# Altium footprint library my_lib.PcbLib: 121 footprints (part 6 of 8)
Each footprint in its own frame and in the unit in brackets; x right, y up, seen from the top. Pads: shape width x height; smd on the part's side, far side on the other; paste and mask are expansions set on the pad; w line width, h text height; cw(c..) or ccw(c..) is an arc to the next point about the centre after c.
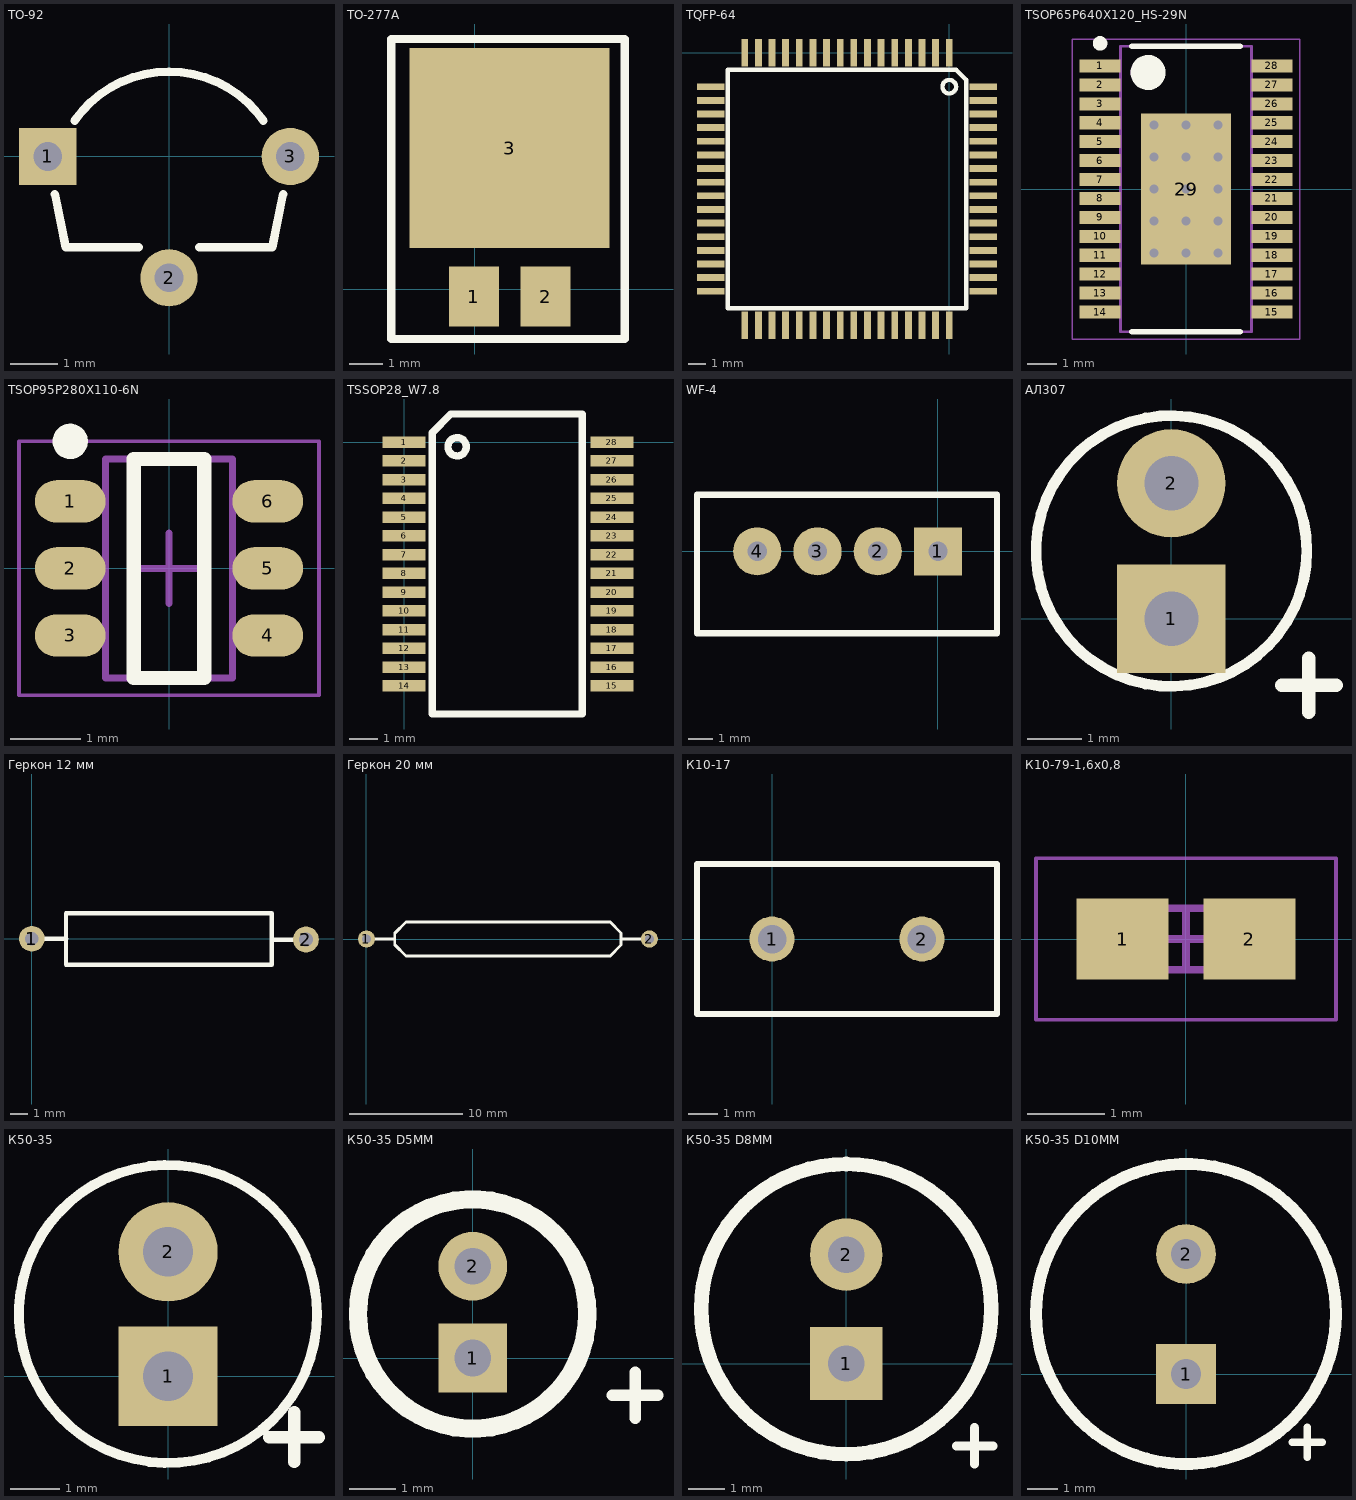
[diagram p5: the footprints below, top view; thin cyan lines are the x and y axes]

## TO-92 [mm]
pads (3):
  rect 1.2x1.2 hole 0.6: 1(-2.54,0)
  round 1.2 hole 0.6: 2(0,-2.54) 3(2.54,0)
Top Overlay:
  lines w0.178: -2.388,-0.787 -2.159,-1.905 -0.635,-1.905 ; -1.977,0.749 cw(c0,-0.635) 1.977,0.749 ; 0.635,-1.905 2.159,-1.905 2.388,-0.787

## TO-277A [mm]
pads (3):
  rect 1.5x1.8 smd: 1(-0.025,-0.225) 2(2.125,-0.225)
  rect 6x6 smd: 3(1.05,4.225)
Top Overlay:
  lines w0.254: -2.5,-1.5 4.5,-1.5 4.5,7.5 -2.5,7.5 -2.5,-1.5
3D body "User Library-TO-277A(SMPC).sldprt": height 1.2, standoff 0, extent -1.325,-0.575 3.425,6.075

## TQFP-64 [mm]
pads (64):
  rect 0.4x1.6 smd: 1(0,0) 2(-0.8,0) 3(-1.6,0) 4(-2.4,0) 5(-3.2,0) 6(-4,0) 7(-4.8,0) 8(-5.6,0) 9(-6.4,0) 10(-7.2,0) 11(-8,0) 12(-8.8,0) 13(-9.6,0) 14(-10.4,0) 15(-11.2,0) 16(-12,0) 33(-12,-16) 34(-11.2,-16) 35(-10.4,-16) 36(-9.6,-16) 37(-8.8,-16) 38(-8,-16) 39(-7.2,-16) 40(-6.4,-16) 41(-5.6,-16) 42(-4.8,-16) 43(-4,-16) 44(-3.2,-16) 45(-2.4,-16) 46(-1.6,-16) 47(-0.8,-16) 48(0,-16)
  rect 1.6x0.4 smd: 17(-14,-2) 18(-14,-2.8) 19(-14,-3.6) 20(-14,-4.4) 21(-14,-5.2) 22(-14,-6) 23(-14,-6.8) 24(-14,-7.6) 25(-14,-8.4) 26(-14,-9.2) 27(-14,-10) 28(-14,-10.8) 29(-14,-11.6) 30(-14,-12.4) 31(-14,-13.2) 32(-14,-14) 49(2,-14) 50(2,-13.2) 51(2,-12.4) 52(2,-11.6) 53(2,-10.8) 54(2,-10) 55(2,-9.2) 56(2,-8.4) 57(2,-7.6) 58(2,-6.8) 59(2,-6) 60(2,-5.2) 61(2,-4.4) 62(2,-3.6) 63(2,-2.8) 64(2,-2)
Top Overlay:
  circle w0.254: c0,-2 r0.4
  lines w0.254: -13.002,-15.002 1,-15.002 1,-1.6 0.4,-1 -13.002,-1 -13.002,-15.002

## TSOP65P640X120_HS-29N [mm] "TSOP, 28-Leads, Body 9,70x4,40mm, Pitch 0,65mm, Thermal Pad 5,18x3,10mm, IPC Medium Density"
height 1.2
pads (29):
  rect 1.4x0.45 smd: 1(-2.95,4.225) 2(-2.95,3.575) 3(-2.95,2.925) 4(-2.95,2.275) 5(-2.95,1.625) 6(-2.95,0.975) 7(-2.95,0.325) 8(-2.95,-0.325) 9(-2.95,-0.975) 10(-2.95,-1.625) 11(-2.95,-2.275) 12(-2.95,-2.925) 13(-2.95,-3.575) 14(-2.95,-4.225) 15(2.95,-4.225) 16(2.95,-3.575) 17(2.95,-2.925) 18(2.95,-2.275) 19(2.95,-1.625) 20(2.95,-0.975) 21(2.95,-0.325) 22(2.95,0.325) 23(2.95,0.975) 24(2.95,1.625) 25(2.95,2.275) 26(2.95,2.925) 27(2.95,3.575) 28(2.95,4.225)
  rect 3.1x5.18 smd: 29(0,0)
via 1.1,-2.2 diameter 0.6 hole 0.3
via 0,-2.2 diameter 0.6 hole 0.3
via -1.1,-2.2 diameter 0.6 hole 0.3
via 1.1,-1.1 diameter 0.6 hole 0.3
via 0,-1.1 diameter 0.6 hole 0.3
via -1.1,-1.1 diameter 0.6 hole 0.3
via 1.1,0 diameter 0.6 hole 0.3
via 0,0 diameter 0.6 hole 0.3
via -1.1,0 diameter 0.6 hole 0.3
via 1.1,1.1 diameter 0.6 hole 0.3
via 0,1.1 diameter 0.6 hole 0.3
via -1.1,1.1 diameter 0.6 hole 0.3
via 1.1,2.2 diameter 0.6 hole 0.3
via 0,2.2 diameter 0.6 hole 0.3
via -1.1,2.2 diameter 0.6 hole 0.3
Top Overlay:
  circle w0.6: c-1.3,4 r0.3
  circle w0.25: c-2.95,5 r0.125
  lines w0.2: -1.85,-4.9 1.85,-4.9 ; -1.85,4.9 1.85,4.9
Mechanical 13:
  circle w0.1: c-1.35,4 r0.5
  lines w0.1: -2.25,-4.9 2.25,-4.9 2.25,4.9 -2.25,4.9 -2.25,-4.9
Mechanical 15:
  lines w0.05: -3.9,-5.15 3.9,-5.15 3.9,5.15 -3.9,5.15 -3.9,-5.15
  lines w0.1: -0.5,0 0.5,0 ; 0,-0.5 0,0.5
3D body "TSOP65P640X120_HS-29N.step": height 1.2, standoff 0, extent -3.2,-4.9 3.2,4.9

## TSOP95P280X110-6N [mm] "TSOP, 6-Leads, Body 2,90x1,60mm, Pitch 0,95mm, IPC Medium Density"
height 1.1
pads (6):
  oval 1x0.6 smd: 1(-1.4,0.95) 2(-1.4,0) 3(-1.4,-0.95) 4(1.4,-0.95) 5(1.4,0) 6(1.4,0.95)
Top Overlay:
  circle w0.25: c-1.4,1.8 r0.125
  lines w0.2: -0.5,-1.55 0.5,-1.55 0.5,1.55 -0.5,1.55 -0.5,-1.55
Mechanical 13:
  lines w0.1: -0.9,-1.55 0.9,-1.55 0.9,1.55 -0.9,1.55 -0.9,-1.55
Mechanical 15:
  lines w0.05: -2.125,-1.8 2.125,-1.8 2.125,1.8 -2.125,1.8 -2.125,-1.8
  lines w0.1: -0.5,0 0.5,0 ; 0,-0.5 0,0.5
3D body "TSOP95P280X110-6N.step": height 1.1, standoff 0, extent -1.393,-1.55 1.393,1.55

## TSSOP28_W7.8 [mm]
pads (28):
  rect 1.5x0.4 smd: 1(0,0) 2(0,-0.65) 3(0,-1.3) 4(0,-1.95) 5(0,-2.6) 6(0,-3.25) 7(0,-3.9) 8(0,-4.55) 9(0,-5.2) 10(0,-5.85) 11(0,-6.5) 12(0,-7.15) 13(0,-7.8) 14(0,-8.45) 15(7.209,-8.45) 16(7.209,-7.8) 17(7.209,-7.15) 18(7.209,-6.5) 19(7.209,-5.85) 20(7.209,-5.2) 21(7.209,-4.55) 22(7.209,-3.9) 23(7.209,-3.25) 24(7.209,-2.6) 25(7.209,-1.95) 26(7.209,-1.3) 27(7.209,-0.65) 28(7.209,0)
Top Overlay:
  circle w0.254: c1.84,-0.161 r0.318
  lines w0.254: 0.975,-9.425 6.175,-9.425 6.175,0.975 1.625,0.975 0.975,0.325 0.975,-9.425

## WF-4 [mm]
pads (4):
  rect 2x2 hole 0.8: 1(0,0)
  round 2 hole 0.8: 2(-2.5,0) 3(-5,0) 4(-7.5,0)
Top Overlay:
  lines w0.254: -10,-3.4 2.45,-3.4 2.45,2.35 -10,2.35 -10,-3.4
3D body "B4B-XH-AM.step": height 3.5, standoff -7, extent -9.95,-3.4 2.45,2.35

## АЛ307 [mm]
pads (2):
  rect 2x2 hole 1: 1(0,0)
  round 2 hole 1: 2(0,2.5)
Top Overlay:
  circle w0.2: c0,1.25 r2.5
  lines w0.25: 2.04,-1.23 3.04,-1.23 ; 2.54,-1.73 2.54,-0.73

## Геркон 12 мм [mm]
pads (2):
  round 1.5 hole 0.8: 1(0,0)
  oval 1.5x1.524 hole 0.8: 2(16,-0.049)
Top Overlay:
  lines w0.254: 0,0 2,0 ; 14,-0.061 16,-0.061 ; 14,1.451 14,-1.518 1.998,-1.518 1.998,-0.03 ; 14,1.482 1.998,1.482 ; 1.998,-0.03 1.998,1.482 ; 1.998,-0.03 1.998,1.482
3D body: height 5, standoff 2.5, extent 2,-1.549 14,1.451

## Геркон 20 мм [mm]
pads (2):
  round 1.5 hole 0.8: 1(0,0)
  oval 1.5x1.524 hole 0.8: 2(25,0)
Top Overlay:
  lines w0.254: 0,0 2.5,0 ; 2.536,-0.539 3.498,-1.5 ; 2.536,0.539 3.498,1.5 ; 22.5,0 25,0 ; 3.498,-1.5 2.5,-0.502 2.5,0.502 3.498,1.5 ; 3.498,-1.5 21.539,-1.5 ; 3.498,1.5 21.539,1.5 ; 21.539,-1.5 22.5,-0.539 ; 21.539,-1.5 22.5,-0.539 ; 21.539,1.5 22.5,0.539 ; 21.539,1.5 22.5,0.539 ; 22.5,-0.539 22.5,0.539
3D body: height 4, standoff 1, extent 2.5,-1.5 22.5,1.5

## К10-17 [mil]
pads (2):
  round 60 hole 38: 1(0,0) 2(200,0)
Top Overlay:
  lines w7.87: -100,-100 -100,100 300,100 300,-100 -100,-100

## К10-79-1,6х0,8 [mm] "Chip Capacitor, 2-Leads, Body 1,60x0,80mm, IPC Low Density"
height 0.7
pads (2):
  rect 1.2x1.05 smd: 1(-0.825,0) 2(0.825,0)
Mechanical 13:
  lines w0.1: -0.8,-0.4 0.8,-0.4 0.8,0.4 -0.8,0.4 -0.8,-0.4
Mechanical 15:
  lines w0.05: -1.95,-1.05 1.95,-1.05 1.95,1.05 -1.95,1.05 -1.95,-1.05
  lines w0.1: -0.4,0 0.4,0 ; 0,-0.4 0,0.4
3D body: height 0.7, standoff 0, extent 0.3,-0.4 0.8,0.4
3D body: height 0.7, standoff 0, extent -0.8,-0.4 -0.3,0.4
3D body: height 0.7, standoff 0, extent -0.3,-0.4 0.3,0.4

## К50-35 [mm]
pads (2):
  rect 2x2 hole 1: 1(0,0)
  round 2 hole 1: 2(0,2.5)
Top Overlay:
  circle w0.2: c0,1.25 r3
  lines w0.25: 2.04,-1.23 3.04,-1.23 ; 2.54,-1.73 2.54,-0.73

## К50-35 D5MM [mm]
pads (2):
  rect 1.5x1.5 hole 0.8: 1(0,0)
  round 1.5 hole 0.8: 2(0,2)
Top Overlay:
  lines w0.25: 3.04,-0.81 4.04,-0.81 ; 3.54,-1.31 3.54,-0.31
  lines w0.4: -2.5,0.96 ccw(c0,0.96) 2.5,0.96 ccw(c0,0.96) -2.5,0.96
3D body "cap_el_d5_h11_pitch2_w0.5.stp": height 11.01, standoff -3, extent -2.498,-1.505 2.5,3.505

## К50-35 D8MM [mm]
pads (2):
  rect 2x2 hole 1: 1(0,0)
  round 2 hole 1: 2(0,3)
Top Overlay:
  lines w0.25: 3.04,-2.27 4.04,-2.27 ; 3.54,-2.77 3.54,-1.77
  lines w0.4: -4,1.5 ccw(c0,1.5) 4,1.5 ccw(c0,1.5) -4,1.5

## К50-35 D10MM [mm]
pads (2):
  rect 2x2 hole 1: 1(0,0)
  round 2 hole 1: 2(0,4)
Top Overlay:
  lines w0.25: 3.54,-2.27 4.54,-2.27 ; 4.04,-2.77 4.04,-1.77
  lines w0.4: -5,2 ccw(c0,2) 5,2 ccw(c0,2) -5,2